# Altium footprint library alex_footprint.PcbLib: 262 footprints (part 3 of 17)
Each footprint in its own frame and in the unit in brackets; x right, y up, seen from the top. Pads: shape width x height; smd on the part's side, far side on the other; paste and mask are expansions set on the pad; w line width, h text height; cw(c..) or ccw(c..) is an arc to the next point about the centre after c.
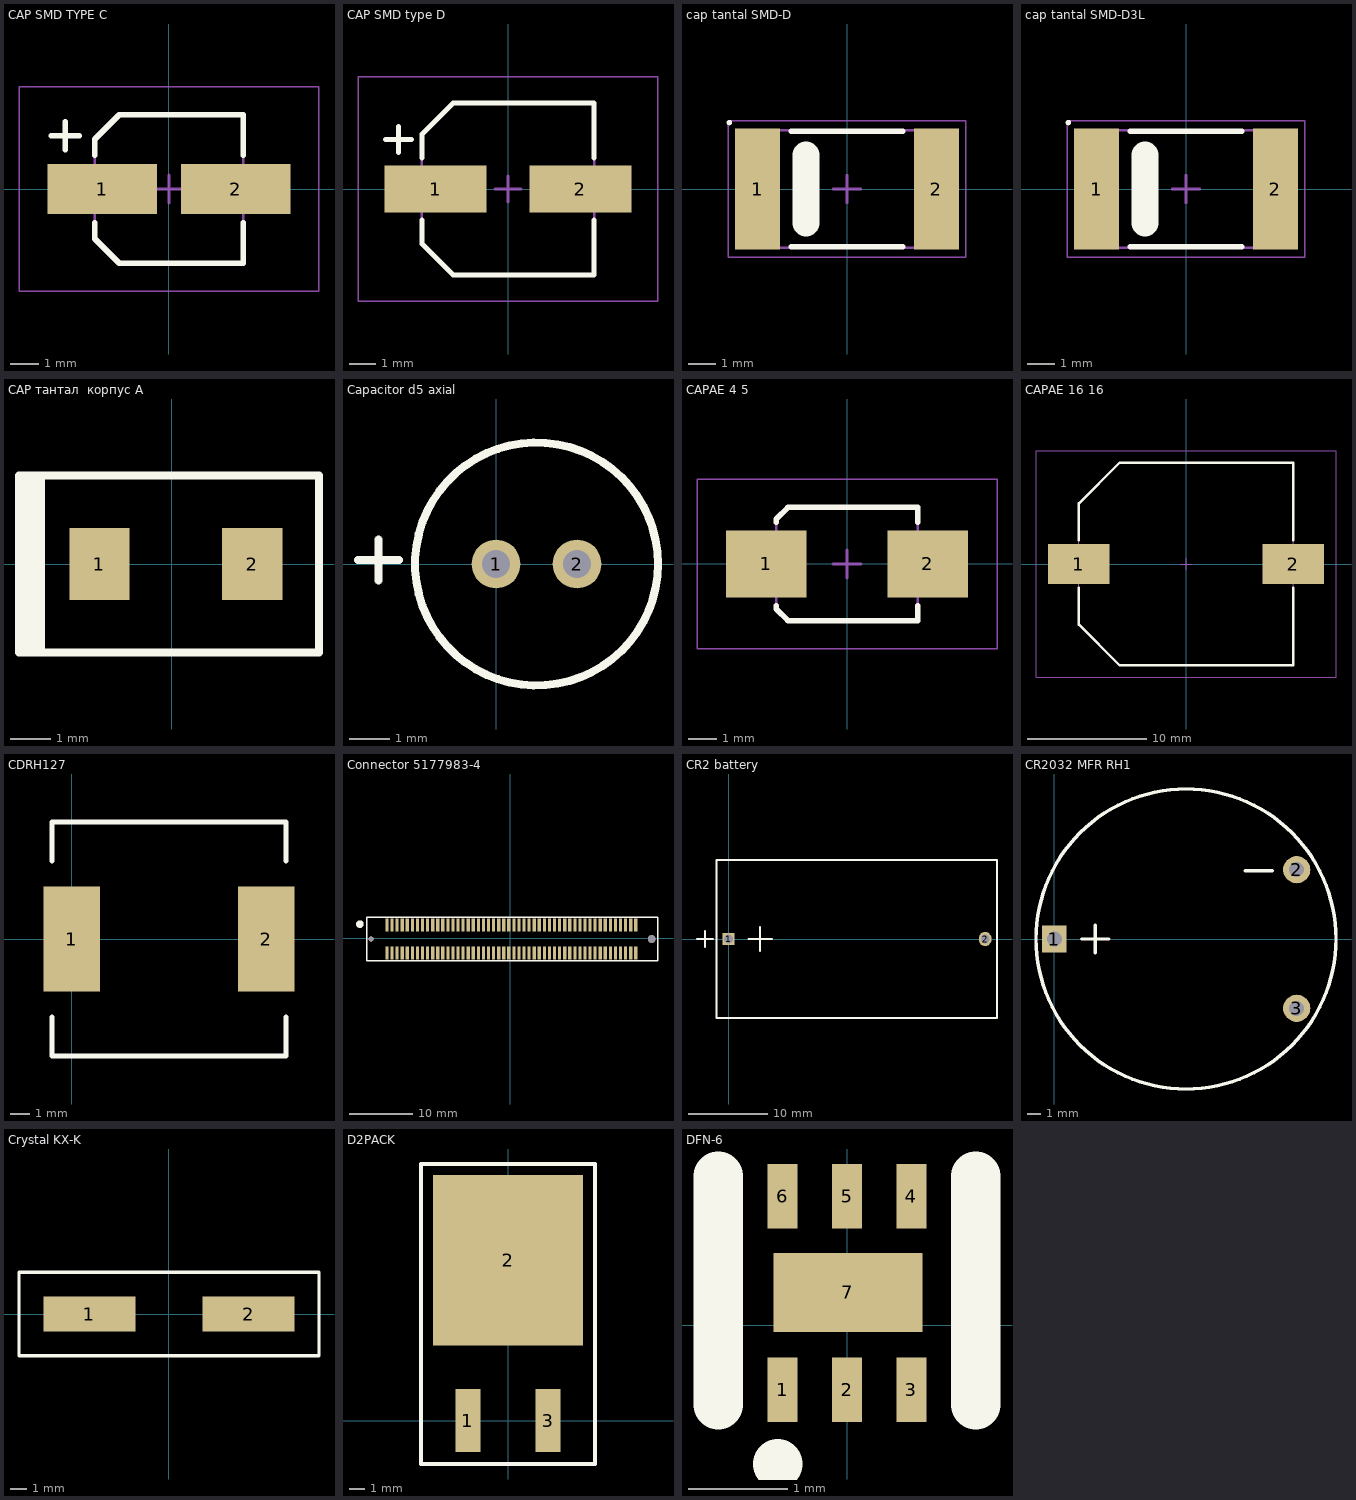
[diagram p2: the footprints below, top view; thin cyan lines are the x and y axes]

## CAP SMD TYPE C [mm]
height 6
pads (2):
  rect 3.9x1.8 smd: 1(-2.375,0) 2(2.375,0)
Top Overlay:
  lines w0.2: -4.2,1.9 -3.2,1.9 ; -3.7,1.4 -3.7,2.4 ; -2.65,-1.2 -2.65,-1.775 -1.775,-2.65 2.65,-2.65 2.65,-1.2 ; -2.65,1.2 -2.65,1.775 -1.775,2.65 2.65,2.65 2.65,1.2
Mechanical 13:
  lines w0.1: -2.65,-1.775 -1.775,-2.65 2.65,-2.65 2.65,2.65 -1.775,2.65 -2.65,1.775 -2.65,-1.775
Mechanical 15:
  lines w0.05: -5.35,-3.65 -5.35,3.65 5.35,3.65 5.35,-3.65 -5.35,-3.65
  lines w0.1: -0.5,0 0.5,0 ; 0,-0.5 0,0.5
3D body: height 2, standoff 0, extent -2.65,-2.65 2.65,2.65
3D body: height 6, standoff 0, extent -2.5,-2.5 2.5,2.5

## CAP SMD type D [mm]
height 6
pads (2):
  rect 3.9x1.8 smd: 1(-2.775,0) 2(2.775,0)
Top Overlay:
  lines w0.2: -4.7,1.9 -3.7,1.9 ; -4.2,1.4 -4.2,2.4 ; -3.3,-1.2 -3.3,-2.1 -2.1,-3.3 3.3,-3.3 3.3,-1.2 ; -3.3,1.2 -3.3,2.1 -2.1,3.3 3.3,3.3 3.3,1.2
Mechanical 13:
  lines w0.1: -3.3,-2.1 -2.1,-3.3 3.3,-3.3 3.3,3.3 -2.1,3.3 -3.3,2.1 -3.3,-2.1
Mechanical 15:
  lines w0.05: -5.75,-4.3 -5.75,4.3 5.75,4.3 5.75,-4.3 -5.75,-4.3
  lines w0.1: -0.5,0 0.5,0 ; 0,-0.5 0,0.5
3D body: height 2, standoff 0, extent -3.3,-3.3 3.3,3.3
3D body: height 6, standoff 0, extent -3.15,-3.15 3.15,3.15

## cap tantal SMD-D [mm]
height 4
pads (2):
  rect 1.65x4.45 smd: 1(-3.275,0) 2(3.275,0)
Top Overlay:
  circle w0.1: c-4.312,2.437 r0.05
  lines w0.2: -2.05,-2.125 2.05,-2.125 ; -2.05,2.125 2.05,2.125
  lines w1: -1.5,-1.25 -1.5,1.25
Mechanical 13:
  lines w0.1: -3.65,-2.15 -3.65,2.15 3.65,2.15 3.65,-2.15 -3.65,-2.15
Mechanical 15:
  lines w0.05: -4.35,-2.5 -4.35,2.5 4.35,2.5 4.35,-2.5 -4.35,-2.5
  lines w0.1: -0.5,0 0.5,0 ; 0,-0.5 0,0.5
3D body: height 4, standoff 0, extent -2.9,-2.15 2.9,2.15
3D body: height 4, standoff 0, extent -3.65,-2.15 -2.9,2.15
3D body: height 4, standoff 0, extent 2.9,-2.15 3.65,2.15

## cap tantal SMD-D3L [mm]
height 4
pads (2):
  rect 1.65x4.45 smd: 1(-3.275,0) 2(3.275,0)
Top Overlay:
  circle w0.1: c-4.312,2.437 r0.05
  lines w0.2: -2.05,-2.125 2.05,-2.125 ; -2.05,2.125 2.05,2.125
  lines w1: -1.5,-1.25 -1.5,1.25
Mechanical 13:
  lines w0.1: -3.65,-2.15 -3.65,2.15 3.65,2.15 3.65,-2.15 -3.65,-2.15
Mechanical 15:
  lines w0.05: -4.35,-2.5 -4.35,2.5 4.35,2.5 4.35,-2.5 -4.35,-2.5
  lines w0.1: -0.5,0 0.5,0 ; 0,-0.5 0,0.5
3D body: height 4, standoff 0, extent -2.9,-2.15 2.9,2.15
3D body: height 4, standoff 0, extent -3.65,-2.15 -2.9,2.15
3D body: height 4, standoff 0, extent 2.9,-2.15 3.65,2.15

## CAP тантал  корпус А [mm]
pads (2):
  rect 1.5x1.8 smd: 1(-1.8,0) 2(2,0)
Top Overlay:
  lines w0.2: -3.8,2.2 -3.8,0 -3.8,-2.2 3.356,-2.2 ; -3.75,-2.1 -3.75,0 -3.75,2.2 3.656,2.2 3.656,-2.1 ; -3.7,-2.2 -3.7,0 -3.7,2.2 ; -3.65,-2.2 -3.65,-0.3 ; -3.65,2.1 -3.65,-0.3 ; -3.65,2.2 -3.65,-0.3 ; -3.55,0 -3.55,2.2 -3.35,2 -3.35,0.3 -3.35,-2.2 ; -3.5,2.2 -3.5,0 -3.5,-2.2 3.656,-2.2 3.656,2.1 ; -3.45,-2.1 -3.45,0.15 ; -3.25,-2.2 -3.25,0 -3.25,2.2

## Capacitor d5 axial [mm]
pads (2):
  round 1.2 hole 0.7: 1(0,0) 2(2,0)
Top Overlay:
  circle w0.2: c1,0 r3
  lines w0.2: -3.408,0.1 -2.392,0.1 ; -2.9,-0.408 -2.9,0.608

## CAPAE 4 5 [mm]
height 5
pads (2):
  rect 2.85x2.35 smd: 1(-2.85,0) 2(2.85,0)
Top Overlay:
  lines w0.2: -2.5,-1.475 -2.5,-1.587 -2.087,-2 2.5,-2 2.5,-1.475 ; -2.5,1.475 -2.5,1.587 -2.087,2 2.5,2 2.5,1.475
Mechanical 13:
  lines w0.1: -2.5,-1.587 -2.5,1.587 -2.087,2 2.5,2 2.5,-2 -2.087,-2 -2.5,-1.587
Mechanical 15:
  lines w0.05: -5.3,-3 5.3,-3 5.3,3 -5.3,3 -5.3,-3
  lines w0.1: -0.5,0 0.5,0 ; 0,-0.5 0,0.5
3D body: height 5, standoff 0, extent -2,-2 2,2
3D body: height 1.67, standoff 0, extent -2.5,-2 2.5,2

## CAPAE 16 16 [mm]
height 16
pads (2):
  rect 5.15x3.35 smd: 1(-9,0) 2(9,0)
Top Overlay:
  lines w0.2: -9,-1.975 -9,-5.088 -5.587,-8.5 9,-8.5 9,-1.975 ; -9,1.975 -9,5.088 -5.587,8.5 9,8.5 9,1.975
Mechanical 13:
  lines w0.1: -9,-5.088 -5.587,-8.5 9,-8.5 9,8.5 -5.587,8.5 -9,5.088 -9,-5.088
Mechanical 15:
  lines w0.05: -12.6,-9.5 -12.6,9.5 12.6,9.5 12.6,-9.5 -12.6,-9.5
  lines w0.1: -0.5,0 0.5,0 ; 0,-0.5 0,0.5
3D body: height 5.34, standoff 0, extent -9,-8.5 9,8.5
3D body: height 16, standoff 0, extent -8,-8 8,8

## CDRH127 [mm]
height 8
pads (2):
  rect 2.9x5.4 smd: 1(0,0) 2(10,0)
Top Overlay:
  lines w0.254: -1,-4 -1,-6 11,-6 11,-4 ; -1,4 -1,6 11,6 11,4

## Connector 5177983-4 [mm]
pads (102):
  rect 0.5x2 smd: 1(-19.4,2.1) 2(-19.4,-2.3) 3(-18.6,2.1) 4(-18.6,-2.3) 5(-17.8,2.1) 6(-17.8,-2.3) 7(-17,2.1) 8(-17,-2.3) 9(-16.2,2.1) 10(-16.2,-2.3) 11(-15.4,2.1) 12(-15.4,-2.3) 13(-14.6,2.1) 14(-14.6,-2.3) 15(-13.8,2.1) 16(-13.8,-2.3) 17(-13,2.1) 18(-13,-2.3) 19(-12.2,2.1) 20(-12.2,-2.3) 21(-11.4,2.1) 22(-11.4,-2.3) 23(-10.6,2.1) 24(-10.6,-2.3) 25(-9.8,2.1) 26(-9.8,-2.3) 27(-9,2.1) 28(-9,-2.3) 29(-8.2,2.1) 30(-8.2,-2.3) 31(-7.4,2.1) 32(-7.4,-2.3) 33(-6.6,2.1) 34(-6.6,-2.3) 35(-5.8,2.1) 36(-5.8,-2.3) 37(-5,2.1) 38(-5,-2.3) 39(-4.2,2.1) 40(-4.2,-2.3) 41(-3.4,2.1) 42(-3.4,-2.3) 43(-2.6,2.1) 44(-2.6,-2.3) 45(-1.8,2.1) 46(-1.8,-2.3) 47(-1,2.1) 48(-1,-2.3) 49(-0.2,2.1) 50(-0.2,-2.3) 51(0.6,2.1) 52(0.6,-2.3) 53(1.4,2.1) 54(1.4,-2.3) 55(2.2,2.1) 56(2.2,-2.3) 57(3,2.1) 58(3,-2.3) 59(3.8,2.1) 60(3.8,-2.3) 61(4.6,2.1) 62(4.6,-2.3) 63(5.4,2.1) 64(5.4,-2.3) 65(6.2,2.1) 66(6.2,-2.3) 67(7,2.1) 68(7,-2.3) 69(7.8,2.1) 70(7.8,-2.3) 71(8.6,2.1) 72(8.6,-2.3) 73(9.4,2.1) 74(9.4,-2.3) 75(10.2,2.1) 76(10.2,-2.3) 77(11,2.1) 78(11,-2.3) 79(11.8,2.1) 80(11.8,-2.3) 81(12.6,2.1) 82(12.6,-2.3) 83(13.4,2.1) 84(13.4,-2.3) 85(14.2,2.1) 86(14.2,-2.3) 87(15,2.1) 88(15,-2.3) 89(15.8,2.1) 90(15.8,-2.3) 91(16.6,2.1) 92(16.6,-2.3) 93(17.4,2.1) 94(17.4,-2.3) 95(18.2,2.1) 96(18.2,-2.3) 97(19,2.1) 98(19,-2.3) 99(19.8,2.1) 100(19.8,-2.3)
  round 1.2 hole 1.2: 101(22.3,-0.1)
  round 0.8 hole 0.8: 102(-21.9,-0.1)
Top Overlay:
  circle w0.6: c-23.663,2.247 r0.3
  lines w0.2: -22.6,-3.5 15.3,-3.5 23.3,-3.5 23.3,3.3 15.3,3.3 -22.6,3.3 -22.6,-3.5
Mechanical 11:
  lines w0.025: 23.3,-3.5 23.3,3.3
3D body "c-5177983-4-a-3d.stp": height 3.8, standoff -0.45, extent -22.65,-3.05 23.15,2.95

## CR2 battery [mm]
height 12
pads (2):
  rect 1.5x1.5 hole 1.1: 1(0,0)
  oval 1.6x1.8 hole 1.1: 2(32.5,0)
Top Overlay:
  lines w0.254: -4,0 -3,0 -2,0 ; -3,-1 -3,1 ; 2.5,0 4,0 5.5,0 ; 4,-1.5 4,1.5 ; -1.5,-10 -1.5,10 34,10 34,-10 -1.5,-10

## CR2032 MFR RH1 [mm]
pads (3):
  rect 1.8x2 hole 1.1: 1(0,0)
  round 2 hole 1.1: 2(17.78,5.08) 3(17.78,-5.08)
Top Overlay:
  circle w0.254: c9.66,0 r11
  lines w0.254: 2,0 4,0 ; 3,-1 3,1 ; 14,5 16,5
Mechanical 7:
  text ".Designator" at 6.5,-13 h1.5

## Crystal KX-K [mm]
pads (2):
  rect 5.5x2.1 smd: 1(-4.75,0) 2(4.75,0)
Top Overlay:
  lines w0.2: -8.95,-2.5 8.95,-2.5 8.95,2.5 -8.95,2.5 -8.95,0 -8.95,-2.5

## D2PACK [mm]
pads (3):
  rect 1.6x4 smd: 1(-2.54,0) 3(2.54,0)
  rect 9.5x10.8 smd: 2(0,10.16)
Top Overlay:
  lines w0.254: -5.5,-2.75 -5.5,16.25 5.5,16.25 5.5,-2.75 -5.5,-2.75

## DFN-6 [mm]
pads (7):
  rect 0.3x0.65 smd: 1(-0.65,-0.65) 2(0,-0.65) 3(0.65,-0.65) 4(0.65,1.3) 5(0,1.3) 6(-0.65,1.3)
  rect 1.5x0.8 smd: 7(0.01,0.33)
Top Overlay:
  lines w0.5: -1.3,-0.8 -1.3,1.5 ; 1.3,-0.8 1.3,1.5 ; -0.7,-1.4 -0.7,-1.4

## DFN-D [mm]